# Altium footprint library Core Board.PcbLib: 2 footprints
Each footprint in its own frame and in the unit in brackets; x right, y up, seen from the top. Pads: shape width x height; smd on the part's side, far side on the other; paste and mask are expansions set on the pad; w line width, h text height; cw(c..) or ccw(c..) is an arc to the next point about the centre after c.
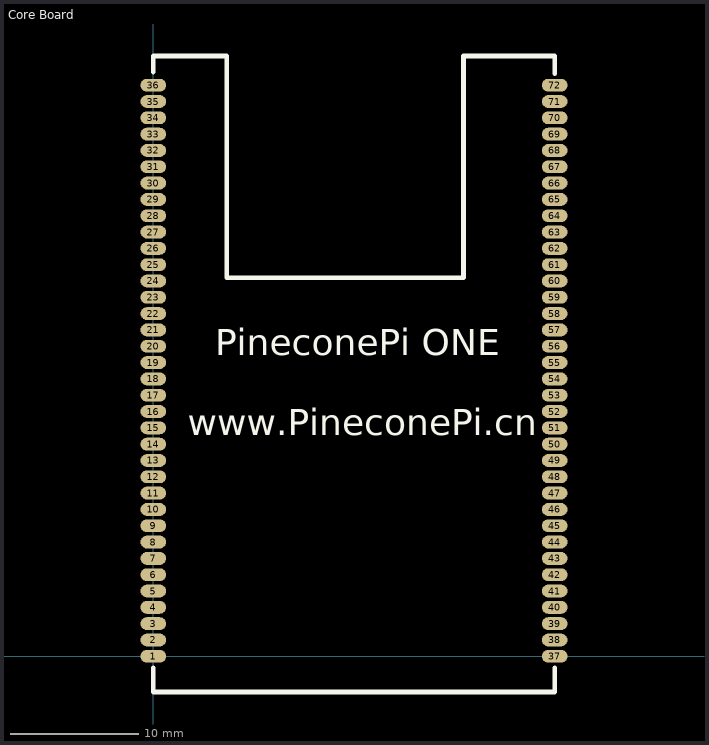
[diagram p0: the footprints below, top view; thin cyan lines are the x and y axes]

## Core Board [mm] "PineconePi ONE"
pads (72):
  oval 2x1 smd: 1(0,0) 2(0,1.27) 3(0,2.54) 4(0,3.81) 5(0,5.08) 6(0,6.35) 7(0,7.62) 8(0,8.89) 9(0,10.16) 10(0,11.43) 11(0,12.7) 12(0,13.97) 13(0,15.24) 14(0,16.51) 15(0,17.78) 16(0,19.05) 17(0,20.32) 18(0,21.59) 19(0,22.86) 20(0,24.13) 21(0,25.4) 22(0,26.67) 23(0,27.94) 24(0,29.21) 25(0,30.48) 26(0,31.75) 27(0,33.02) 28(0,34.29) 29(0,35.56) 30(0,36.83) 31(0,38.1) 32(0,39.37) 33(0,40.64) 34(0,41.91) 35(0,43.18) 36(0,44.45) 37(31.242,0) 38(31.242,1.27) 39(31.242,2.54) 40(31.242,3.81) 41(31.242,5.08) 42(31.242,6.35) 43(31.242,7.62) 44(31.242,8.89) 45(31.242,10.16) 46(31.242,11.43) 47(31.242,12.7) 48(31.242,13.97) 49(31.242,15.24) 50(31.242,16.51) 51(31.242,17.78) 52(31.242,19.05) 53(31.242,20.32) 54(31.242,21.59) 55(31.242,22.86) 56(31.242,24.13) 57(31.242,25.4) 58(31.242,26.67) 59(31.242,27.94) 60(31.242,29.21) 61(31.242,30.48) 62(31.242,31.75) 63(31.242,33.02) 64(31.242,34.29) 65(31.242,35.56) 66(31.242,36.83) 67(31.242,38.1) 68(31.242,39.37) 69(31.242,40.64) 70(31.242,41.91) 71(31.242,43.18) 72(31.242,44.45)
Top Overlay:
  lines w0.381: 0,-0.889 0,-2.794 31.242,-2.794 31.242,-0.889 ; 0,45.466 0,46.736 3.175,46.736 5.715,46.736 5.715,32.385 5.715,31.115 5.715,29.464 ; 7.239,29.464 5.715,29.464 ; 24.003,29.464 5.715,29.464 ; 24.13,29.464 24.13,46.736 31.242,46.736 31.242,45.339 ; 24.13,30.734 24.13,33.147
  text "PineconePi ONE" at 4.826,22.733 h3.52
  text "www.PineconePi.cn" at 2.667,16.51 h3.52

## PCBComponent_1 [mm]